# Altium footprint library ie-track-kit-arduino-1.PcbLib: 53 footprints (part 3 of 4)
Each footprint in its own frame and in the unit in brackets; x right, y up, seen from the top. Pads: shape width x height; smd on the part's side, far side on the other; paste and mask are expansions set on the pad; w line width, h text height; cw(c..) or ccw(c..) is an arc to the next point about the centre after c.
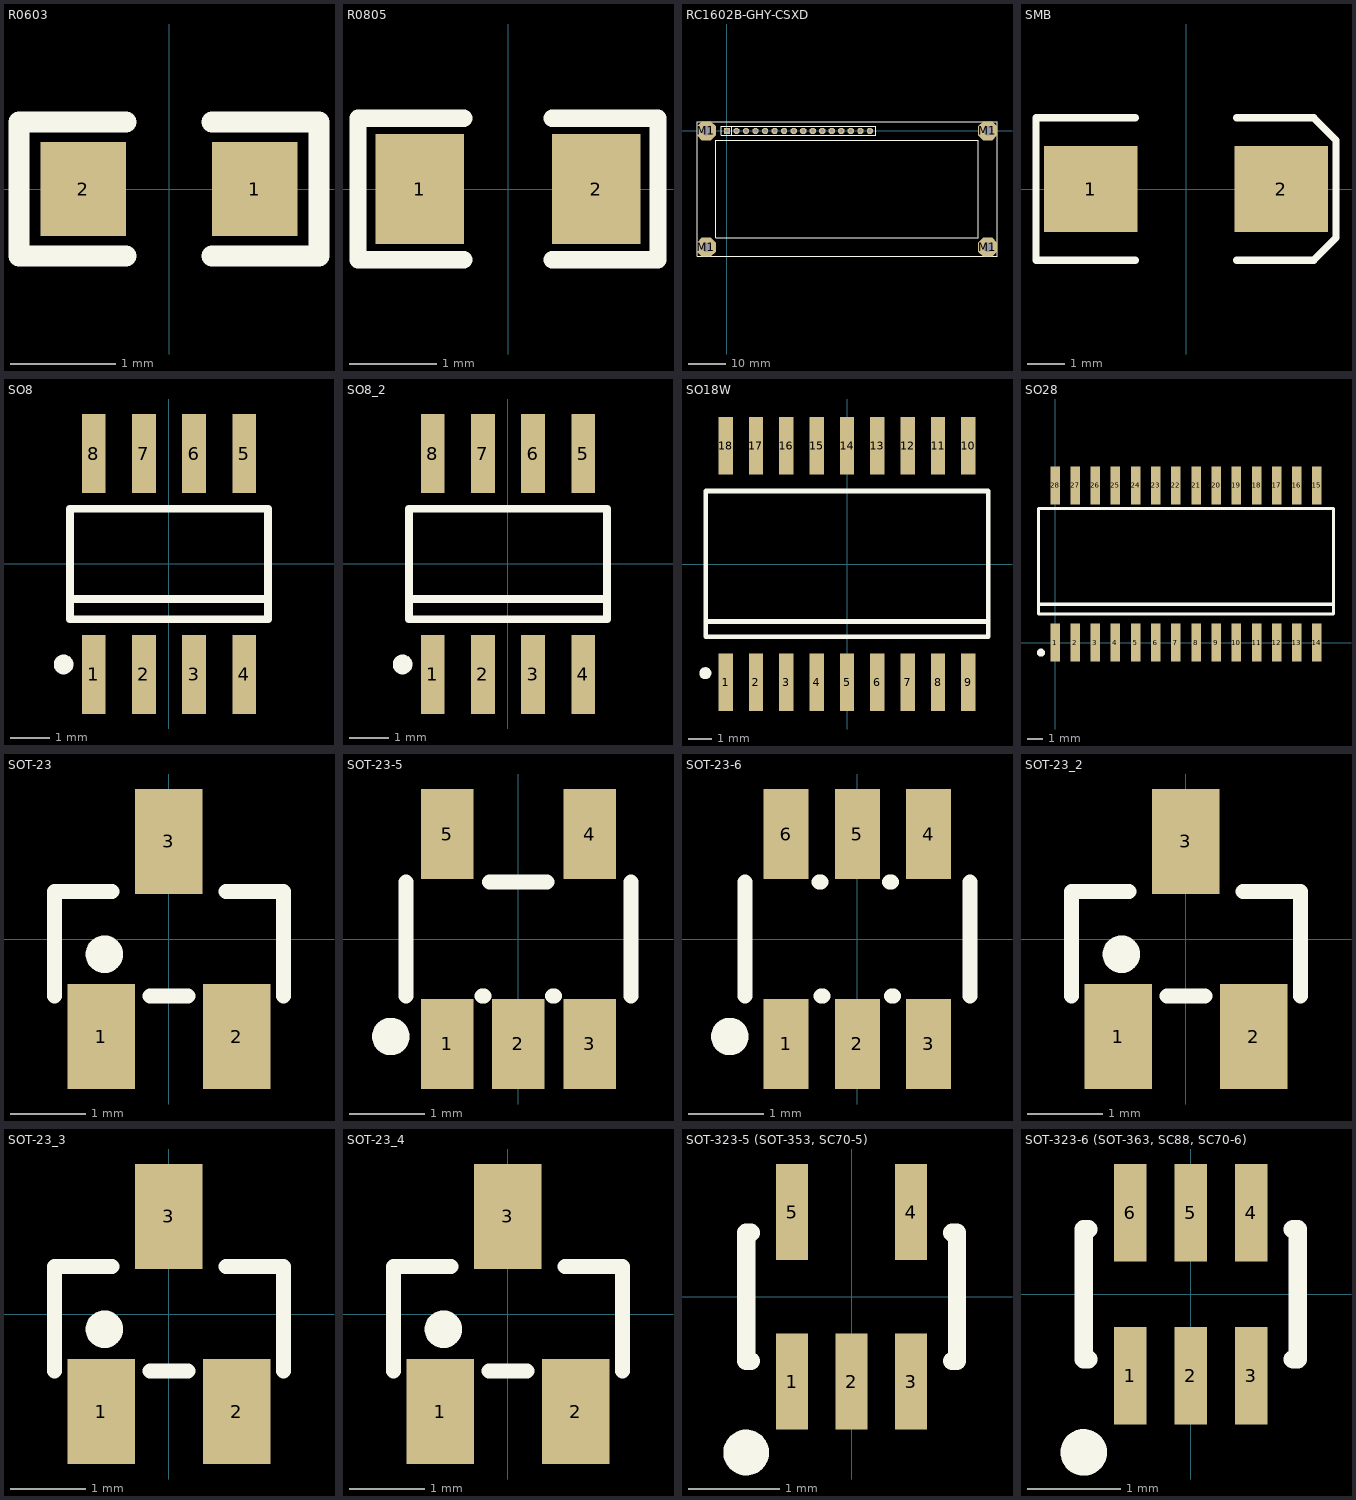
[diagram p2: the footprints below, top view; thin cyan lines are the x and y axes]

## R0603 [mil]
height 62.99
pads (2):
  rect 32x35 smd: 1(32,0) 2(-32,0)
Top Overlay:
  lines w7.87: -16,-25 -56,-25 -56,25 -16,25 ; 16,-25 56,-25 56,25 16,25
3D body "User Library-0603 SMD Resistor.step": height 11.89, standoff 0, extent -31.49,-15.74 31.5,15.75

## R0805 [mil]
height 49.21
pads (2):
  rect 40x50 smd: 1(-40,0) 2(40,0)
Top Overlay:
  lines w7.87: -20,-32 -68,-32 -68,32 -20,32 ; 20,-32 68,-32 68,32 20,32
3D body "User Library-0805 SMD Resistor.step": height 30.79, standoff 0, extent -39.36,-24.6 39.37,24.61

## RC1602B-GHY-CSXD [mm]
pads (20):
  rect 1.651x1.651 hole 1: 1(0,0)
  oct 1.651x1.651 hole 1: 2(2.54,0) 3(5.08,0) 4(7.62,0) 5(10.16,0) 6(12.7,0) 7(15.24,0) 8(17.78,0) 9(20.32,0) 10(22.86,0) 11(25.4,0) 12(27.94,0) 13(30.48,0) 14(33.02,0) 15(35.56,0) 16(38.1,0)
  oct 5x5 hole 2.5: M1(-5.5,-31) M1(-5.5,0) M1(69.5,-31) M1(69.5,0)
Top Overlay:
  lines w0.254: 1.27,-1.2 1.27,1.143 ; -8,-33.5 -8,2.5 72,2.5 72,-33.5 -8,-33.5 ; -3,-28.5 67,-28.5 67,-2.5 -3,-2.5 -3,-28.5 ; -1.524,-1.2 -1.524,1.2 39.64,1.2 39.64,-1.2 -1.524,-1.2
3D body "Samtec-TSW-116-23-F-S.STEP": height 13.92, standoff 2.62, extent -1.27,-1.27 39.37,1.27
3D body "User Library-CCT LCD 2x16.step": height 20.4, standoff 8.41, extent -8,-33.5 72,2.5
3D body "Samtec-SSW-116-01-G-S.step": height 8.51, standoff -2.64, extent -1.524,-1.207 39.624,1.207
3D body "User Library-MADA-10.step": height 14.2, standoff -3.2, extent -7.8,-2.3 -3.2,2.3
3D body "User Library-MADA-10.step": height 14.2, standoff -3.2, extent -7.8,-33.3 -3.2,-28.7
3D body "User Library-MADA-10.step": height 14.2, standoff -3.2, extent 67.2,-33.3 71.8,-28.7
3D body "User Library-MADA-10.step": height 14.2, standoff -3.2, extent 67.2,-2.3 71.8,2.3

## SMB [mm]
height 2.4
pads (2):
  rect 2.5x2.3 smd: 1(-2.54,0) 2(2.54,0)
Top Overlay:
  lines w0.2: -1.35,-1.9 -4,-1.9 -4,1.9 -1.35,1.9 ; 1.35,-1.9 3.4,-1.9 4,-1.3 4,1.3 3.4,1.9 1.35,1.9
3D body "SW3dPS-DO-214AA SMB.step": height 2.3, standoff 0, extent -2.7,-1.8 2.7,1.8

## SO8 [mm] "Small Outline; 8 Leads; Body Width 3.7 mm; Pitch 1.27 mm"
height 1.65
pads (8):
  rect 0.6x2 smd: 1(-1.905,-2.794) 2(-0.635,-2.794) 3(0.635,-2.794) 4(1.905,-2.794) 5(1.905,2.794) 6(0.635,2.794) 7(-0.635,2.794) 8(-1.905,2.794)
Top Overlay:
  circle w0.25: c-2.665,-2.54 r0.125
  lines w0.2: -2.5,-0.881 2.5,-0.881 ; -2.5,-1.397 2.5,-1.397 2.5,1.397 -2.5,1.397 -2.5,-1.397
3D body "SW3dPS-SOIC08-150.step": height 1.75, standoff 0, extent -2.4,-2.9 2.4,2.9

## SO8_2 [mm]
pads (8):
  rect 0.6x2 smd: 1(-1.905,-2.794) 2(-0.635,-2.794) 3(0.635,-2.794) 4(1.905,-2.794) 5(1.905,2.794) 6(0.635,2.794) 7(-0.635,2.794) 8(-1.905,2.794)
Top Overlay:
  circle w0.25: c-2.665,-2.54 r0.125
  lines w0.2: -2.5,-0.881 2.5,-0.881 ; -2.5,-1.397 2.5,-1.397 2.5,1.397 -2.5,1.397 -2.5,-1.397
3D body "SW3dPS-SOIC08-150.step": height 1.75, standoff 0, extent -2.4,-2.9 2.4,2.9

## SO18W [mm]
height 1.6
pads (18):
  rect 0.6x2.4 smd: 1(-5.08,-4.953) 2(-3.81,-4.953) 3(-2.54,-4.953) 4(-1.27,-4.953) 5(0,-4.953) 6(1.27,-4.953) 7(2.54,-4.953) 8(3.81,-4.953) 9(5.08,-4.953) 10(5.08,4.953) 11(3.81,4.953) 12(2.54,4.953) 13(1.27,4.953) 14(0,4.953) 15(-1.27,4.953) 16(-2.54,4.953) 17(-3.81,4.953) 18(-5.08,4.953)
Top Overlay:
  circle w0.25: c-5.93,-4.572 r0.125
  lines w0.2: -5.91,-2.41 5.91,-2.41 ; -5.91,-3.047 -5.91,-0.632 -5.91,0.638 -5.91,3.053 5.91,3.053 5.91,-3.047 -5.91,-3.047
3D body "User Library-SOIC18-300.step": height 2.65, standoff 0, extent -5.765,-5.15 5.765,5.15

## SO28 [mm] "Small Outline; 28 Leads; Body Width 8.38 mm; Pitch 1.27 mm"
height 3
pads (28):
  rect 0.6x2.4 smd: 1(0,0) 2(1.27,0) 3(2.54,0) 4(3.81,0) 5(5.08,0) 6(6.35,0) 7(7.62,0) 8(8.89,0) 9(10.16,0) 10(11.43,0) 11(12.7,0) 12(13.97,0) 13(15.24,0) 14(16.51,0) 15(16.51,9.906) 16(15.24,9.906) 17(13.97,9.906) 18(12.7,9.906) 19(11.43,9.906) 20(10.16,9.906) 21(8.89,9.906) 22(7.62,9.906) 23(6.35,9.906) 24(5.08,9.906) 25(3.81,9.906) 26(2.54,9.906) 27(1.27,9.906) 28(0,9.906)
Top Overlay:
  circle w0.25: c-0.889,-0.635 r0.125
  lines w0.2: -1.045,2.413 17.555,2.413 ; -1.045,8.445 17.555,8.445
  lines w0.203: -1.045,8.445 -1.045,1.807 17.555,1.807 17.555,8.445
3D body "SW3dPS-SOIC28-300.step": height 2.65, standoff 0, extent -0.695,-0.07 17.205,10.23

## SOT-23 [mm]
height 1.6
pads (3):
  rect 0.9x1.4 smd: 1(-0.9,-1.3) 2(0.9,-1.3) 3(0,1.3)
Top Overlay:
  circle w0.25: c-0.862,-0.203 r0.125
  lines w0.2: -1.524,-0.762 -1.524,0.635 -0.762,0.635 ; -0.254,-0.762 0.254,-0.762 ; 0.762,0.635 1.524,0.635 1.524,-0.762
3D body "SW3dPS-3-lead sot23-3.step": height 1, standoff -0.02, extent -1.46,-1.25 1.46,1.226

## SOT-23-5 [mm] ", AKA: SOT753 (NXP), TSOP5 (NXP)"
height 1.6
pads (5):
  rect 0.7x1.2 smd: 1(-0.95,-1.4) 2(0,-1.4) 3(0.95,-1.4) 4(0.95,1.4) 5(-0.95,1.4)
Top Overlay:
  circle w0.25: c-1.7,-1.3 r0.125
  lines w0.2: -1.5,-0.762 -1.5,0.762 ; -0.483,-0.762 -0.457,-0.762 ; -0.381,0.762 0.381,0.762 ; 0.457,-0.762 0.483,-0.762 ; 1.5,-0.762 1.5,0.762
3D body "SW3dPS-SOT23-5.STEP": height 1.14, standoff 0.04, extent -1.45,-1.403 1.45,1.397

## SOT-23-6 [mm] "SOT23-6, AKA: SOT-26 (Diodes), SuperSOT-6 (Fairchild), SOT753 (NXP), TSOP5 (NXP)"
height 1.6
pads (6):
  rect 0.6x1.2 smd mask+0.07: 1(-0.95,-1.4) 2(0,-1.4) 3(0.95,-1.4) 4(0.95,1.4) 5(0,1.4) 6(-0.95,1.4)
Top Overlay:
  circle w0.25: c-1.7,-1.3 r0.125
  lines w0.2: -1.5,-0.762 -1.5,0.762 ; -0.508,0.762 -0.483,0.762 ; -0.483,-0.762 -0.457,-0.762 ; 0.432,0.762 0.457,0.762 ; 0.457,-0.762 0.483,-0.762 ; 1.5,-0.762 1.5,0.762
3D body "User Library-sot-23-6-2.step": height 1.09, standoff 0, extent -1.397,-1.213 1.397,1.213

## SOT-23_2 [mm]
pads (3):
  rect 0.9x1.4 smd: 1(-0.9,-1.3) 2(0.9,-1.3) 3(0,1.3)
Top Overlay:
  circle w0.25: c-0.862,-0.203 r0.125
  lines w0.2: -1.524,-0.762 -1.524,0.635 -0.762,0.635 ; -0.254,-0.762 0.254,-0.762 ; 0.762,0.635 1.524,0.635 1.524,-0.762
3D body "SW3dPS-3-lead sot23-3.step": height 1, standoff -0.02, extent -1.46,-1.25 1.46,1.226

## SOT-23_3 [mm]
pads (3):
  rect 0.9x1.4 smd: 1(-0.9,-1.3) 2(0.9,-1.3) 3(0,1.3)
Top Overlay:
  circle w0.25: c-0.862,-0.203 r0.125
  lines w0.2: -1.524,-0.762 -1.524,0.635 -0.762,0.635 ; -0.254,-0.762 0.254,-0.762 ; 0.762,0.635 1.524,0.635 1.524,-0.762
3D body "SW3dPS-3-lead sot23-3.step": height 1, standoff -0.02, extent -1.46,-1.25 1.46,1.226

## SOT-23_4 [mm]
pads (3):
  rect 0.9x1.4 smd: 1(-0.9,-1.3) 2(0.9,-1.3) 3(0,1.3)
Top Overlay:
  circle w0.25: c-0.862,-0.203 r0.125
  lines w0.2: -1.524,-0.762 -1.524,0.635 -0.762,0.635 ; -0.254,-0.762 0.254,-0.762 ; 0.762,0.635 1.524,0.635 1.524,-0.762
3D body "SW3dPS-3-lead sot23-3.step": height 1, standoff -0.02, extent -1.46,-1.25 1.46,1.226

## SOT-323-5 (SOT-353, SC70-5) [mm] "SOT-353/SC-88A; 5 Leads; Body 2.2 x 2.2 mm, inc. leads (LxW max)"
height 1.1
pads (5):
  rect 0.35x1.05 smd: 1(-0.65,-0.925) 2(0,-0.925) 3(0.65,-0.925) 4(0.65,0.925) 5(-0.65,0.925)
Top Overlay:
  circle w0.25: c-1.15,-1.7 r0.125
  lines w0.2: -1.1,-0.7 -1.15,-0.7 -1.15,0.7 -1.1,0.7 ; 1.1,-0.7 1.15,-0.7 1.15,0.7 1.1,0.7
3D body "User Library-sot353.step": height 1, standoff 0, extent -1.05,-1.125 1.05,1.175

## SOT-323-6 (SOT-363, SC88, SC70-6) [mm] "SOT-363; 6 Leads; Body 2.2 x 2.2 mm, inc. leads (LxW max)"
height 1.1
pads (6):
  rect 0.35x1.05 smd: 1(-0.65,-0.875) 2(0,-0.875) 3(0.65,-0.875) 4(0.65,0.875) 5(0,0.875) 6(-0.65,0.875)
Top Overlay:
  circle w0.25: c-1.15,-1.7 r0.125
  lines w0.2: -1.1,-0.7 -1.15,-0.7 -1.15,0.7 -1.1,0.7 ; 1.1,-0.7 1.15,-0.7 1.15,0.7 1.1,0.7
3D body "User Library-sot363.step": height 1, standoff 0, extent -1.05,-1.15 1.05,1.15